# Altium schematic symbol library TI Amplifiers and Linear Operational Amplifier High Speed.SchLib: 1100 symbols (part 25 of 25)
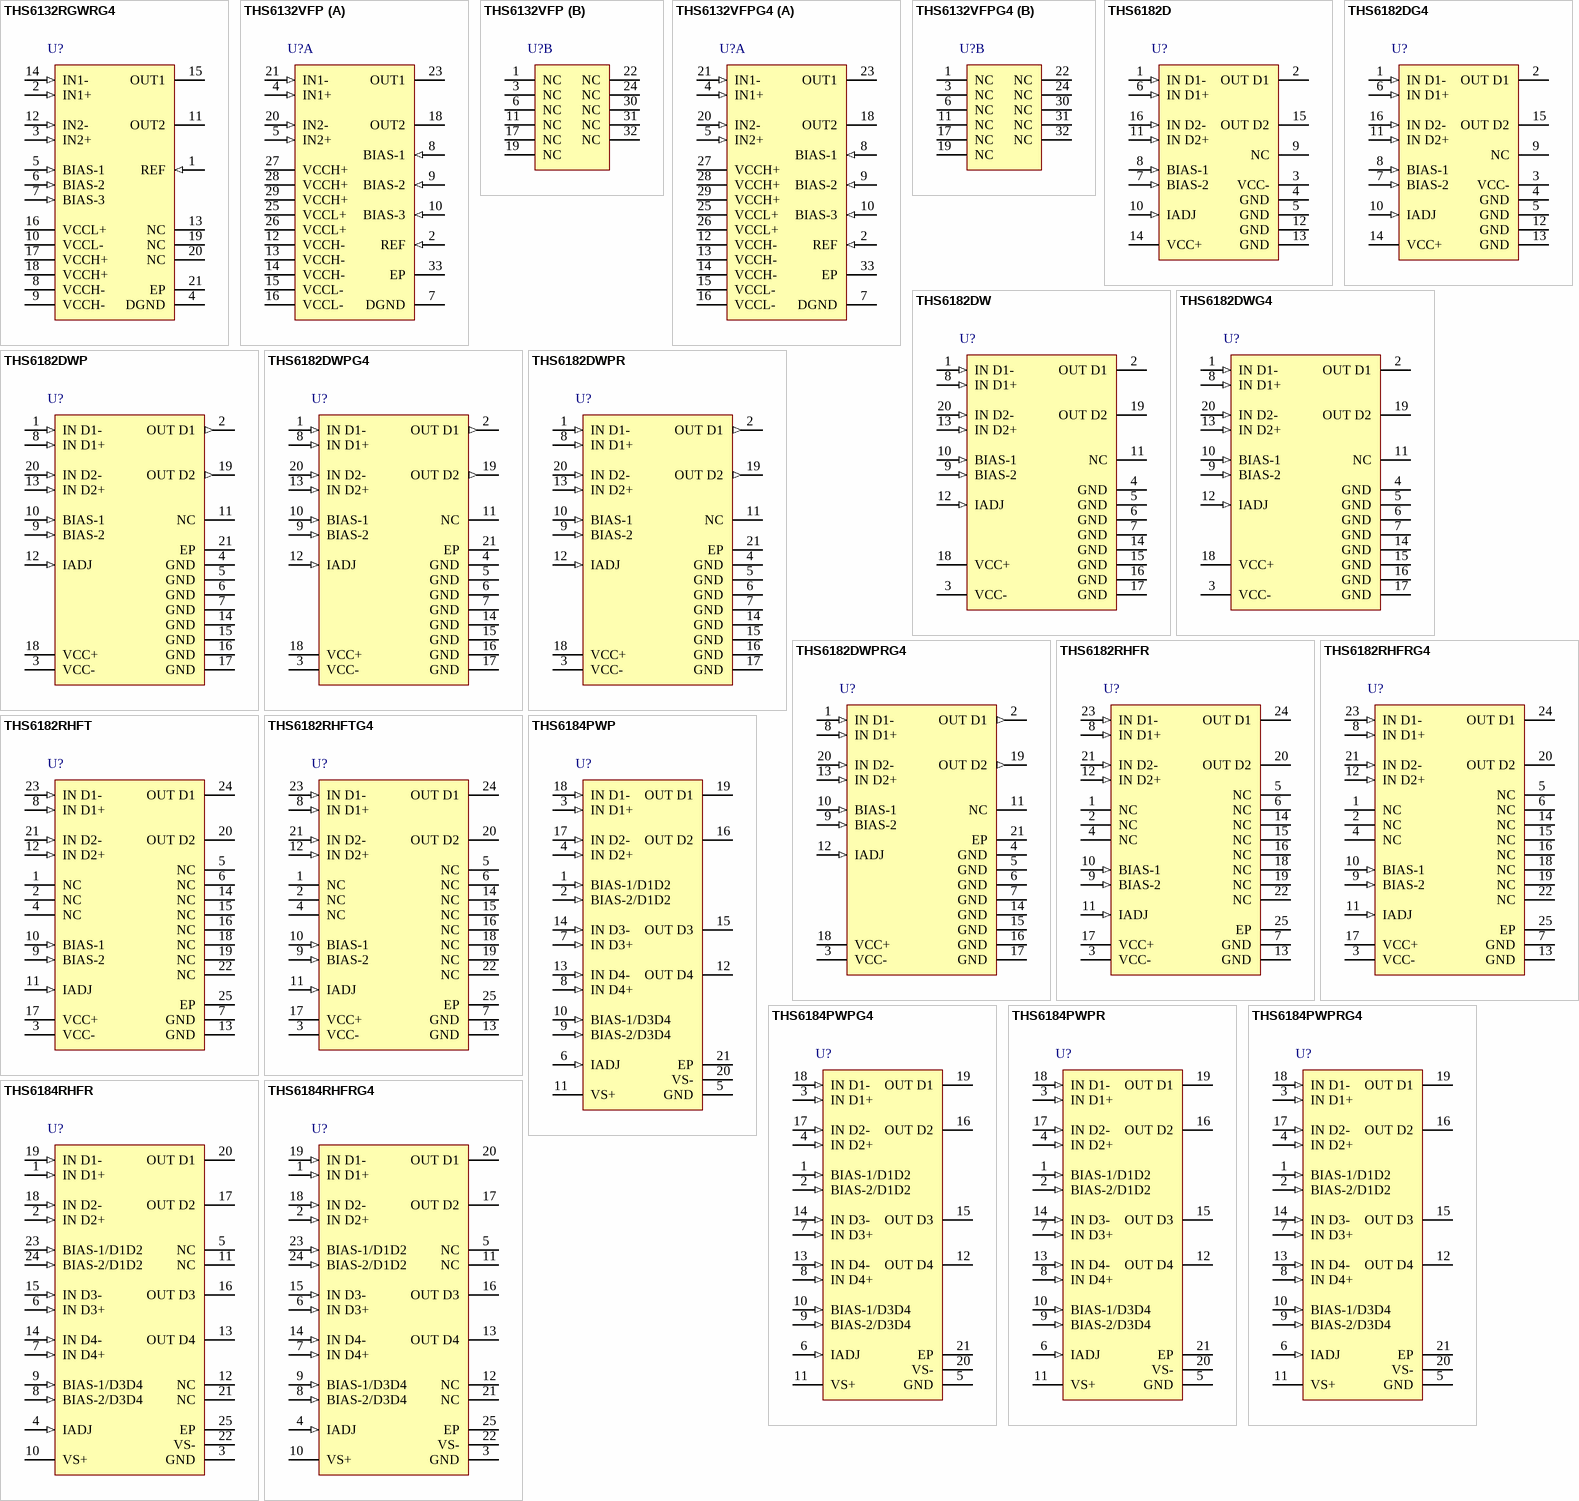
[diagram p75: symbols THS6132RGWRG4 to THS6184RHFRG4]

## THS6182RHFR
designator U?
Low Power Dissipation ADSL Line Driver, 10 to 30 V, -40 to 85 degC, 24-pin QFN (RHF24), Green (RoHS & no Sb/Br); Manufacturer: Texas Instruments; PartNumber: THS6182RHFR; 2nd Harmonic(dBc): 88; 3rd Harmonic(dBc): 107; @ MHz: 1; BW @ Acl(MHz): 100; Iib(Max)(nA): 20000; Io(Typ)(mA): 600; Iq per channel(Max)(mA): 12.5; Number of Channels: 2; Slew Rate(Typ)(V/us): 450; Sub Family: High Output Current Amplifier (>=50mA), High Speed Amplifier (>=50MHz), High Supply Voltage Amplifier (>=30V); THD (Fc is 1 MHz)(Typ)(dB): -88; Vio(Max)(mV): 20; Vn at Flatband(Typ)(nV/rtHz): 3.2; Vs(Max)(V): 30; Vs(Min)(V): 10; DatasheetVersion: SLLS544H; PackageVersion: 4204845-2/H, 06/2011; PackageReference: RHF24-3650X2650TP; PackageDescription: 24-Pin Plastic Flat Pack, Body 4 x 5 mm, Pitch 0.5 mm; Supplier 1: Digi-Key; Supplier Part Number 1: 296-15338-2-ND; Supplier 2: Digi-Key; Supplier Part Number 2: 296-15338-1-ND; Supplier 3: Digi-Key; Supplier Part Number 3: 296-15338-6-ND; Supplier 4: Newark; Supplier Part Number 4: 82H5816; Supplier 5: Mouser; Supplier Part Number 5: 595-THS6182RHFR; Acl, min stable gain(V/V): 1; Eco-Plan: Green (RoHS & no Sb/Br); Mounting Technology: Surface Mount; Code_JEDEC: MO-220; ComponentLink1Description: Manufacturer URL; ComponentLink1URL: http://www.ti.com/; ComponentLink2Description: Datasheet; ComponentLink2URL: http://www.ti.com/general/docs/lit/getliterature.tsp?genericPartNumber=THS6182&fileType=pdf; ComponentLink3Description: Package Specification; ComponentLink3URL: http://www.ti.com/litv/pdf/mpqf137g
footprint TI-RHF24-3650X2650TP_V (QFN, 24-Leads, Body 5x4mm, Pitch 0.5mm, Thermal Pad 3.65x2.65mm)
pins: 1 NC, 2 NC, 3 VCC- (power), 4 NC, 5 NC, 6 NC, 7 GND (power), 8 IN D1+ (in), 9 BIAS-2 (in), 10 BIAS-1 (in), 11 IADJ (in), 12 IN D2+ (in), 13 GND (power), 14 NC, 15 NC, 16 NC, 17 VCC+ (power), 18 NC, 19 NC, 20 OUT D2 (hiz), 21 IN D2- (in), 22 NC, 23 IN D1- (in), 24 OUT D1 (hiz), 25 EP (power)

## THS6182RHFRG4
designator U?
Low Power Dissipation ADSL Line Driver, 10 to 30 V, -40 to 85 degC, 24-pin QFN (RHF24), Green (RoHS & no Sb/Br); Manufacturer: Texas Instruments; PartNumber: THS6182RHFRG4; 2nd Harmonic(dBc): 88; 3rd Harmonic(dBc): 107; @ MHz: 1; BW @ Acl(MHz): 100; Iib(Max)(nA): 20000; Io(Typ)(mA): 600; Iq per channel(Max)(mA): 12.5; Number of Channels: 2; Slew Rate(Typ)(V/us): 450; Sub Family: High Output Current Amplifier (>=50mA), High Speed Amplifier (>=50MHz), High Supply Voltage Amplifier (>=30V); THD (Fc is 1 MHz)(Typ)(dB): -88; Vio(Max)(mV): 20; Vn at Flatband(Typ)(nV/rtHz): 3.2; Vs(Max)(V): 30; Vs(Min)(V): 10; DatasheetVersion: SLLS544H; PackageVersion: 4204845-2/H, 06/2011; PackageReference: RHF24-3650X2650TP; PackageDescription: 24-Pin Plastic Flat Pack, Body 4 x 5 mm, Pitch 0.5 mm; Supplier 1: Digi-Key; Supplier Part Number 1: THS6182RHFRG4-ND; Supplier 2: Newark; Supplier Part Number 2: 85K1610; Supplier 3: Mouser; Supplier Part Number 3: 595-THS6182RHFRG4; Acl, min stable gain(V/V): 1; Eco-Plan: Green (RoHS & no Sb/Br); Mounting Technology: Surface Mount; Code_JEDEC: MO-220; ComponentLink1Description: Manufacturer URL; ComponentLink1URL: http://www.ti.com/; ComponentLink2Description: Datasheet; ComponentLink2URL: http://www.ti.com/general/docs/lit/getliterature.tsp?genericPartNumber=THS6182&fileType=pdf; ComponentLink3Description: Package Specification; ComponentLink3URL: http://www.ti.com/litv/pdf/mpqf137g
footprint TI-RHF24-3650X2650TP_V (QFN, 24-Leads, Body 5x4mm, Pitch 0.5mm, Thermal Pad 3.65x2.65mm)
pins: 1 NC, 2 NC, 3 VCC- (power), 4 NC, 5 NC, 6 NC, 7 GND (power), 8 IN D1+ (in), 9 BIAS-2 (in), 10 BIAS-1 (in), 11 IADJ (in), 12 IN D2+ (in), 13 GND (power), 14 NC, 15 NC, 16 NC, 17 VCC+ (power), 18 NC, 19 NC, 20 OUT D2 (hiz), 21 IN D2- (in), 22 NC, 23 IN D1- (in), 24 OUT D1 (hiz), 25 EP (power)

## THS6182RHFT
designator U?
Low Power Dissipation ADSL Line Driver, 10 to 30 V, -40 to 85 degC, 24-pin QFN (RHF24), Green (RoHS & no Sb/Br); Manufacturer: Texas Instruments; PartNumber: THS6182RHFT; 2nd Harmonic(dBc): 88; 3rd Harmonic(dBc): 107; @ MHz: 1; BW @ Acl(MHz): 100; Iib(Max)(nA): 20000; Io(Typ)(mA): 600; Iq per channel(Max)(mA): 12.5; Number of Channels: 2; Slew Rate(Typ)(V/us): 450; Sub Family: High Output Current Amplifier (>=50mA), High Speed Amplifier (>=50MHz), High Supply Voltage Amplifier (>=30V); THD (Fc is 1 MHz)(Typ)(dB): -88; Vio(Max)(mV): 20; Vn at Flatband(Typ)(nV/rtHz): 3.2; Vs(Max)(V): 30; Vs(Min)(V): 10; DatasheetVersion: SLLS544H; PackageVersion: 4204845-2/H, 06/2011; PackageReference: RHF24-3650X2650TP; PackageDescription: 24-Pin Plastic Flat Pack, Body 4 x 5 mm, Pitch 0.5 mm; Supplier 1: Digi-Key; Supplier Part Number 1: THS6182RHFT-ND; Supplier 2: Mouser; Supplier Part Number 2: 595-THS6182RHFT; Acl, min stable gain(V/V): 1; Eco-Plan: Green (RoHS & no Sb/Br); Mounting Technology: Surface Mount; Code_JEDEC: MO-220; ComponentLink1Description: Manufacturer URL; ComponentLink1URL: http://www.ti.com/; ComponentLink2Description: Datasheet; ComponentLink2URL: http://www.ti.com/general/docs/lit/getliterature.tsp?genericPartNumber=THS6182&fileType=pdf; ComponentLink3Description: Package Specification; ComponentLink3URL: http://www.ti.com/litv/pdf/mpqf137g
footprint TI-RHF24-3650X2650TP_V (QFN, 24-Leads, Body 5x4mm, Pitch 0.5mm, Thermal Pad 3.65x2.65mm)
pins: 1 NC, 2 NC, 3 VCC- (power), 4 NC, 5 NC, 6 NC, 7 GND (power), 8 IN D1+ (in), 9 BIAS-2 (in), 10 BIAS-1 (in), 11 IADJ (in), 12 IN D2+ (in), 13 GND (power), 14 NC, 15 NC, 16 NC, 17 VCC+ (power), 18 NC, 19 NC, 20 OUT D2 (hiz), 21 IN D2- (in), 22 NC, 23 IN D1- (in), 24 OUT D1 (hiz), 25 EP (power)

## THS6182RHFTG4
designator U?
Low Power Dissipation ADSL Line Driver, 10 to 30 V, -40 to 85 degC, 24-pin QFN (RHF24), Green (RoHS & no Sb/Br); Manufacturer: Texas Instruments; PartNumber: THS6182RHFTG4; 2nd Harmonic(dBc): 88; 3rd Harmonic(dBc): 107; @ MHz: 1; BW @ Acl(MHz): 100; Iib(Max)(nA): 15000; Io(Typ)(mA): 600; Iq per channel(Max)(mA): 12.5; Number of Channels: 2; Slew Rate(Typ)(V/us): 450; Sub Family: High Output Current Amplifier (>=50mA), High Speed Amplifier (>=50MHz), High Supply Voltage Amplifier (>=30V); THD (Fc is 1 MHz)(Typ)(dB): -88; Vio(Max)(mV): 20; Vn at Flatband(Typ)(nV/rtHz): 3.2; Vs(Max)(V): 30; Vs(Min)(V): 10; DatasheetVersion: SLLS544H; PackageVersion: 4204845-2/H, 06/2011; PackageReference: RHF24-3650X2650TP; PackageDescription: 24-Pin Plastic Flat Pack, Body 4 x 5 mm, Pitch 0.5 mm; Supplier 1: Digi-Key; Supplier Part Number 1: THS6182RHFTG4-ND; Supplier 2: Newark; Supplier Part Number 2: 54K0778; Supplier 3: Mouser; Supplier Part Number 3: 595-THS6182RHFTG4; Acl, min stable gain(V/V): 1; Eco-Plan: Green (RoHS & no Sb/Br); Mounting Technology: Surface Mount; Code_JEDEC: MO-220; ComponentLink1Description: Manufacturer URL; ComponentLink1URL: http://www.ti.com/; ComponentLink2Description: Datasheet; ComponentLink2URL: http://www.ti.com/general/docs/lit/getliterature.tsp?genericPartNumber=THS6182&fileType=pdf; ComponentLink3Description: Package Specification; ComponentLink3URL: http://www.ti.com/litv/pdf/mpqf137g
footprint TI-RHF24-3650X2650TP_V (QFN, 24-Leads, Body 5x4mm, Pitch 0.5mm, Thermal Pad 3.65x2.65mm)
pins: 1 NC, 2 NC, 3 VCC- (power), 4 NC, 5 NC, 6 NC, 7 GND (power), 8 IN D1+ (in), 9 BIAS-2 (in), 10 BIAS-1 (in), 11 IADJ (in), 12 IN D2+ (in), 13 GND (power), 14 NC, 15 NC, 16 NC, 17 VCC+ (power), 18 NC, 19 NC, 20 OUT D2 (hiz), 21 IN D2- (in), 22 NC, 23 IN D1- (in), 24 OUT D1 (hiz), 25 EP (power)

## THS6184PWP
designator U?
xDSL Line Driver, 8 to 32 V, -40 to 85 degC, 20-pin SOP (PWP20), Green (RoHS & no Sb/Br); Manufacturer: Texas Instruments; PartNumber: THS6184PWP; Acl, min stable gain(V/V): 1; BW @ Acl(MHz): 50; Iib(Max)(nA): 15; Io(Typ)(mA): 500; Iq per channel(Max)(mA): 4.2; Number of Channels: 4; Slew Rate(Typ)(V/us): 400; Sub Family: High Output Current Amplifier (>=50mA), High Speed Amplifier (>=50MHz); Vio(Max)(mV): 16; Vn at Flatband(Typ)(nV/rtHz): 2.9; DatasheetVersion: SLLS635D; PackageVersion: 4073225-4/I, 05/2011; PackageReference: PWP20-2965X2290TP; PackageDescription: 20-Pin Plastic Small Outline, Body 4.4 x 6.5 mm, Pitch 0.65 mm; Supplier 1: Digi-Key; Supplier Part Number 1: 296-21670-5-ND; Supplier 2: Farnell; Supplier Part Number 2: 1755442; Supplier 3: Newark; Supplier Part Number 3: 37M0029; Supplier 4: Mouser; Supplier Part Number 4: 595-THS6184PWP; Eco-Plan: Green (RoHS & no Sb/Br); Mounting Technology: Surface Mount; Code_JEDEC: MO-153; ComponentLink1Description: Manufacturer URL; ComponentLink1URL: http://www.ti.com/; ComponentLink2Description: Datasheet; ComponentLink2URL: http://www.ti.com/general/docs/lit/getliterature.tsp?genericPartNumber=THS6184&fileType=pdf; ComponentLink3Description: Package Specification; ComponentLink3URL: http://www.ti.com/litv/pdf/mhts001g
footprint TI-PWP20-2965X2290TP_N (SOP, 20-Leads, Body 6.5x4.4mm, Pitch 0.65mm, Thermal Pad 2.965x2.29mm, IPC Medium Density)
footprint TI-PWP20-2965X2290TP_L (SOP, 20-Leads, Body 6.5x4.4mm, Pitch 0.65mm, Thermal Pad 2.965x2.29mm, IPC High Density)
footprint TI-PWP20-2965X2290TP_M (SOP, 20-Leads, Body 6.5x4.4mm, Pitch 0.65mm, Thermal Pad 2.965x2.29mm, IPC Low Density)
pins: 1 BIAS-1/D1D2 (in), 2 BIAS-2/D1D2 (in), 3 IN D1+ (in), 4 IN D2+ (in), 5 GND (power), 6 IADJ (in), 7 IN D3+ (in), 8 IN D4+ (in), 9 BIAS-2/D3D4 (in), 10 BIAS-1/D3D4 (in), 11 VS+ (power), 12 OUT D4 (hiz), 13 IN D4- (in), 14 IN D3- (in), 15 OUT D3 (hiz), 16 OUT D2 (hiz), 17 IN D2- (in), 18 IN D1- (in), 19 OUT D1 (hiz), 20 VS- (power), 21 EP (power)

## THS6184PWPG4
designator U?
xDSL Line Driver, 8 to 32 V, -40 to 85 degC, 20-pin SOP (PWP20), Green (RoHS & no Sb/Br); Manufacturer: Texas Instruments; PartNumber: THS6184PWPG4; Acl, min stable gain(V/V): 1; BW @ Acl(MHz): 50; Iib(Max)(nA): 15; Io(Typ)(mA): 500; Iq per channel(Max)(mA): 4.2; Number of Channels: 4; Slew Rate(Typ)(V/us): 400; Sub Family: High Output Current Amplifier (>=50mA), High Speed Amplifier (>=50MHz); Vio(Max)(mV): 16; Vn at Flatband(Typ)(nV/rtHz): 2.9; DatasheetVersion: SLLS635D; PackageVersion: 4073225-4/I, 05/2011; PackageReference: PWP20-2965X2290TP; PackageDescription: 20-Pin Plastic Small Outline, Body 4.4 x 6.5 mm, Pitch 0.65 mm; Supplier 1: Digi-Key; Supplier Part Number 1: THS6184PWPG4-ND; Supplier 2: Mouser; Supplier Part Number 2: 595-THS6184PWPG4; Eco-Plan: Green (RoHS & no Sb/Br); Mounting Technology: Surface Mount; Code_JEDEC: MO-153; ComponentLink1Description: Manufacturer URL; ComponentLink1URL: http://www.ti.com/; ComponentLink2Description: Datasheet; ComponentLink2URL: http://www.ti.com/general/docs/lit/getliterature.tsp?genericPartNumber=THS6184&fileType=pdf; ComponentLink3Description: Package Specification; ComponentLink3URL: http://www.ti.com/litv/pdf/mhts001g
footprint TI-PWP20-2965X2290TP_N (SOP, 20-Leads, Body 6.5x4.4mm, Pitch 0.65mm, Thermal Pad 2.965x2.29mm, IPC Medium Density)
footprint TI-PWP20-2965X2290TP_L (SOP, 20-Leads, Body 6.5x4.4mm, Pitch 0.65mm, Thermal Pad 2.965x2.29mm, IPC High Density)
footprint TI-PWP20-2965X2290TP_M (SOP, 20-Leads, Body 6.5x4.4mm, Pitch 0.65mm, Thermal Pad 2.965x2.29mm, IPC Low Density)
pins: 1 BIAS-1/D1D2 (in), 2 BIAS-2/D1D2 (in), 3 IN D1+ (in), 4 IN D2+ (in), 5 GND (power), 6 IADJ (in), 7 IN D3+ (in), 8 IN D4+ (in), 9 BIAS-2/D3D4 (in), 10 BIAS-1/D3D4 (in), 11 VS+ (power), 12 OUT D4 (hiz), 13 IN D4- (in), 14 IN D3- (in), 15 OUT D3 (hiz), 16 OUT D2 (hiz), 17 IN D2- (in), 18 IN D1- (in), 19 OUT D1 (hiz), 20 VS- (power), 21 EP (power)

## THS6184PWPR
designator U?
xDSL Line Driver, 8 to 32 V, -40 to 85 degC, 20-pin SOP (PWP20), Green (RoHS & no Sb/Br); Manufacturer: Texas Instruments; PartNumber: THS6184PWPR; Acl, min stable gain(V/V): 1; BW @ Acl(MHz): 50; Iib(Max)(nA): 15; Io(Typ)(mA): 500; Iq per channel(Max)(mA): 4.2; Number of Channels: 4; Slew Rate(Typ)(V/us): 400; Sub Family: High Output Current Amplifier (>=50mA), High Speed Amplifier (>=50MHz); Vio(Max)(mV): 16; Vn at Flatband(Typ)(nV/rtHz): 2.9; DatasheetVersion: SLLS635D; PackageVersion: 4073225-4/I, 05/2011; PackageReference: PWP20-2965X2290TP; PackageDescription: 20-Pin Plastic Small Outline, Body 4.4 x 6.5 mm, Pitch 0.65 mm; Supplier 1: Digi-Key; Supplier Part Number 1: THS6184PWPR-ND; Supplier 2: Mouser; Supplier Part Number 2: 595-THS6184PWPR; Eco-Plan: Green (RoHS & no Sb/Br); Mounting Technology: Surface Mount; Code_JEDEC: MO-153; ComponentLink1Description: Manufacturer URL; ComponentLink1URL: http://www.ti.com/; ComponentLink2Description: Datasheet; ComponentLink2URL: http://www.ti.com/general/docs/lit/getliterature.tsp?genericPartNumber=THS6184&fileType=pdf; ComponentLink3Description: Package Specification; ComponentLink3URL: http://www.ti.com/litv/pdf/mhts001g
footprint TI-PWP20-2965X2290TP_N (SOP, 20-Leads, Body 6.5x4.4mm, Pitch 0.65mm, Thermal Pad 2.965x2.29mm, IPC Medium Density)
footprint TI-PWP20-2965X2290TP_L (SOP, 20-Leads, Body 6.5x4.4mm, Pitch 0.65mm, Thermal Pad 2.965x2.29mm, IPC High Density)
footprint TI-PWP20-2965X2290TP_M (SOP, 20-Leads, Body 6.5x4.4mm, Pitch 0.65mm, Thermal Pad 2.965x2.29mm, IPC Low Density)
pins: 1 BIAS-1/D1D2 (in), 2 BIAS-2/D1D2 (in), 3 IN D1+ (in), 4 IN D2+ (in), 5 GND (power), 6 IADJ (in), 7 IN D3+ (in), 8 IN D4+ (in), 9 BIAS-2/D3D4 (in), 10 BIAS-1/D3D4 (in), 11 VS+ (power), 12 OUT D4 (hiz), 13 IN D4- (in), 14 IN D3- (in), 15 OUT D3 (hiz), 16 OUT D2 (hiz), 17 IN D2- (in), 18 IN D1- (in), 19 OUT D1 (hiz), 20 VS- (power), 21 EP (power)

## THS6184PWPRG4
designator U?
xDSL Line Driver, 8 to 32 V, -40 to 85 degC, 20-pin SOP (PWP20), Green (RoHS & no Sb/Br); Manufacturer: Texas Instruments; PartNumber: THS6184PWPRG4; Acl, min stable gain(V/V): 1; BW @ Acl(MHz): 50; Iib(Max)(nA): 15; Io(Typ)(mA): 500; Iq per channel(Max)(mA): 4.2; Number of Channels: 4; Slew Rate(Typ)(V/us): 400; Sub Family: High Output Current Amplifier (>=50mA), High Speed Amplifier (>=50MHz); Vio(Max)(mV): 16; Vn at Flatband(Typ)(nV/rtHz): 2.9; DatasheetVersion: SLLS635D; PackageVersion: 4073225-4/I, 05/2011; PackageReference: PWP20-2965X2290TP; PackageDescription: 20-Pin Plastic Small Outline, Body 4.4 x 6.5 mm, Pitch 0.65 mm; Supplier 1: Digi-Key; Supplier Part Number 1: THS6184PWPRG4-ND; Supplier 2: Mouser; Supplier Part Number 2: 595-THS6184PWPRG4; Eco-Plan: Green (RoHS & no Sb/Br); Mounting Technology: Surface Mount; Code_JEDEC: MO-153; ComponentLink1Description: Manufacturer URL; ComponentLink1URL: http://www.ti.com/; ComponentLink2Description: Datasheet; ComponentLink2URL: http://www.ti.com/general/docs/lit/getliterature.tsp?genericPartNumber=THS6184&fileType=pdf; ComponentLink3Description: Package Specification; ComponentLink3URL: http://www.ti.com/litv/pdf/mhts001g
footprint TI-PWP20-2965X2290TP_N (SOP, 20-Leads, Body 6.5x4.4mm, Pitch 0.65mm, Thermal Pad 2.965x2.29mm, IPC Medium Density)
footprint TI-PWP20-2965X2290TP_L (SOP, 20-Leads, Body 6.5x4.4mm, Pitch 0.65mm, Thermal Pad 2.965x2.29mm, IPC High Density)
footprint TI-PWP20-2965X2290TP_M (SOP, 20-Leads, Body 6.5x4.4mm, Pitch 0.65mm, Thermal Pad 2.965x2.29mm, IPC Low Density)
pins: 1 BIAS-1/D1D2 (in), 2 BIAS-2/D1D2 (in), 3 IN D1+ (in), 4 IN D2+ (in), 5 GND (power), 6 IADJ (in), 7 IN D3+ (in), 8 IN D4+ (in), 9 BIAS-2/D3D4 (in), 10 BIAS-1/D3D4 (in), 11 VS+ (power), 12 OUT D4 (hiz), 13 IN D4- (in), 14 IN D3- (in), 15 OUT D3 (hiz), 16 OUT D2 (hiz), 17 IN D2- (in), 18 IN D1- (in), 19 OUT D1 (hiz), 20 VS- (power), 21 EP (power)

## THS6184RHFR
designator U?
xDSL Line Driver, 8 to 32 V, -40 to 85 degC, 24-pin QFN (RHF24), Green (RoHS & no Sb/Br); Manufacturer: Texas Instruments; PartNumber: THS6184RHFR; Acl, min stable gain(V/V): 1; BW @ Acl(MHz): 50; Iib(Max)(nA): 15; Io(Typ)(mA): 500; Iq per channel(Max)(mA): 4.2; Number of Channels: 4; Slew Rate(Typ)(V/us): 400; Sub Family: High Output Current Amplifier (>=50mA), High Speed Amplifier (>=50MHz); Vio(Max)(mV): 16; Vn at Flatband(Typ)(nV/rtHz): 2.9; DatasheetVersion: SLLS635D; PackageVersion: 4204845-2/H, 06/2011; PackageReference: RHF24-3650X2650TP; PackageDescription: 24-Pin Plastic Flat Pack, Body 4 x 5 mm, Pitch 0.5 mm; Supplier 1: Digi-Key; Supplier Part Number 1: THS6184RHFR-ND; Supplier 2: Newark; Supplier Part Number 2: 24K5087; Supplier 3: Mouser; Supplier Part Number 3: 595-THS6184RHFR; Eco-Plan: Green (RoHS & no Sb/Br); Mounting Technology: Surface Mount; Code_JEDEC: MO-220; ComponentLink1Description: Manufacturer URL; ComponentLink1URL: http://www.ti.com/; ComponentLink2Description: Datasheet; ComponentLink2URL: http://www.ti.com/general/docs/lit/getliterature.tsp?genericPartNumber=THS6184&fileType=pdf; ComponentLink3Description: Package Specification; ComponentLink3URL: http://www.ti.com/litv/pdf/mpqf137g
footprint TI-RHF24-3650X2650TP_V (QFN, 24-Leads, Body 5x4mm, Pitch 0.5mm, Thermal Pad 3.65x2.65mm)
pins: 1 IN D1+ (in), 2 IN D2+ (in), 3 GND (power), 4 IADJ (in), 5 NC, 6 IN D3+ (in), 7 IN D4+ (in), 8 BIAS-2/D3D4 (in), 9 BIAS-1/D3D4 (in), 10 VS+ (power), 11 NC, 12 NC, 13 OUT D4 (hiz), 14 IN D4- (in), 15 IN D3- (in), 16 OUT D3 (hiz), 17 OUT D2 (hiz), 18 IN D2- (in), 19 IN D1- (in), 20 OUT D1 (hiz), 21 NC, 22 VS- (power), 23 BIAS-1/D1D2 (in), 24 BIAS-2/D1D2 (in), 25 EP (power)

## THS6184RHFRG4
designator U?
xDSL Line Driver, 8 to 32 V, -40 to 85 degC, 24-pin QFN (RHF24), Green (RoHS & no Sb/Br); Manufacturer: Texas Instruments; PartNumber: THS6184RHFRG4; Acl, min stable gain(V/V): 1; BW @ Acl(MHz): 50; Iib(Max)(nA): 15; Io(Typ)(mA): 500; Iq per channel(Max)(mA): 4.2; Number of Channels: 4; Slew Rate(Typ)(V/us): 400; Sub Family: High Output Current Amplifier (>=50mA), High Speed Amplifier (>=50MHz); Vio(Max)(mV): 16; Vn at Flatband(Typ)(nV/rtHz): 2.9; DatasheetVersion: SLLS635D; PackageVersion: 4204845-2/H, 06/2011; PackageReference: RHF24-3650X2650TP; PackageDescription: 24-Pin Plastic Flat Pack, Body 4 x 5 mm, Pitch 0.5 mm; Supplier 1: Digi-Key; Supplier Part Number 1: THS6184RHFRG4-ND; Supplier 2: Mouser; Supplier Part Number 2: 595-THS6184RHFRG4; Eco-Plan: Green (RoHS & no Sb/Br); Mounting Technology: Surface Mount; Code_JEDEC: MO-220; ComponentLink1Description: Manufacturer URL; ComponentLink1URL: http://www.ti.com/; ComponentLink2Description: Datasheet; ComponentLink2URL: http://www.ti.com/general/docs/lit/getliterature.tsp?genericPartNumber=THS6184&fileType=pdf; ComponentLink3Description: Package Specification; ComponentLink3URL: http://www.ti.com/litv/pdf/mpqf137g
footprint TI-RHF24-3650X2650TP_V (QFN, 24-Leads, Body 5x4mm, Pitch 0.5mm, Thermal Pad 3.65x2.65mm)
pins: 1 IN D1+ (in), 2 IN D2+ (in), 3 GND (power), 4 IADJ (in), 5 NC, 6 IN D3+ (in), 7 IN D4+ (in), 8 BIAS-2/D3D4 (in), 9 BIAS-1/D3D4 (in), 10 VS+ (power), 11 NC, 12 NC, 13 OUT D4 (hiz), 14 IN D4- (in), 15 IN D3- (in), 16 OUT D3 (hiz), 17 OUT D2 (hiz), 18 IN D2- (in), 19 IN D1- (in), 20 OUT D1 (hiz), 21 NC, 22 VS- (power), 23 BIAS-1/D1D2 (in), 24 BIAS-2/D1D2 (in), 25 EP (power)

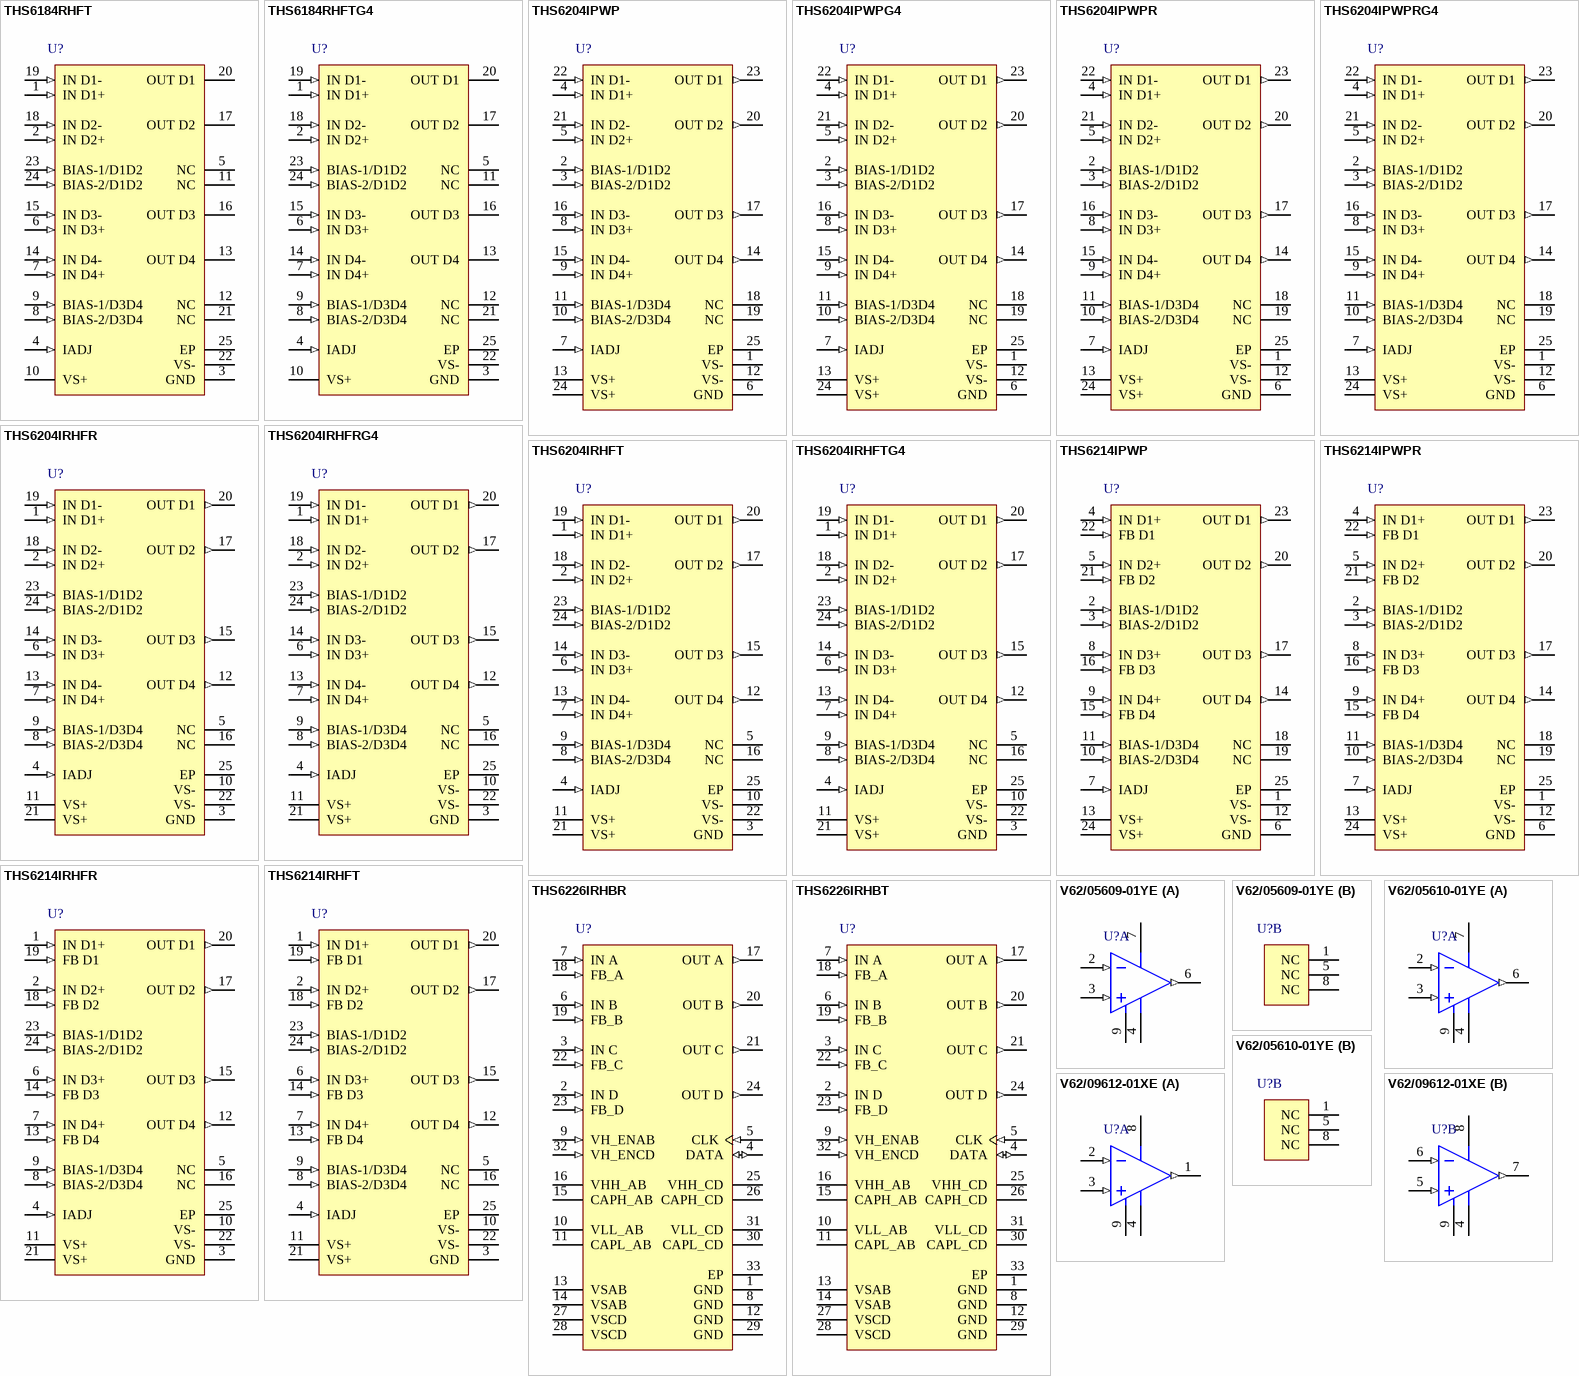
[diagram p51: symbols THS6184RHFT to V62/09612-01XE]

## THS6184RHFT
designator U?
xDSL Line Driver, 8 to 32 V, -40 to 85 degC, 24-pin QFN (RHF24), Green (RoHS & no Sb/Br); Manufacturer: Texas Instruments; PartNumber: THS6184RHFT; Acl, min stable gain(V/V): 1; BW @ Acl(MHz): 50; Iib(Max)(nA): 15; Io(Typ)(mA): 500; Iq per channel(Max)(mA): 4.2; Number of Channels: 4; Slew Rate(Typ)(V/us): 400; Sub Family: High Output Current Amplifier (>=50mA), High Speed Amplifier (>=50MHz); Vio(Max)(mV): 16; Vn at Flatband(Typ)(nV/rtHz): 2.9; DatasheetVersion: SLLS635D; PackageVersion: 4204845-2/H, 06/2011; PackageReference: RHF24-3650X2650TP; PackageDescription: 24-Pin Plastic Flat Pack, Body 4 x 5 mm, Pitch 0.5 mm; Supplier 1: Digi-Key; Supplier Part Number 1: 296-17862-2-ND; Supplier 2: Digi-Key; Supplier Part Number 2: 296-17862-1-ND; Supplier 3: Digi-Key; Supplier Part Number 3: 296-17862-6-ND; Supplier 4: Mouser; Supplier Part Number 4: 595-THS6184RHFT; Eco-Plan: Green (RoHS & no Sb/Br); Mounting Technology: Surface Mount; Code_JEDEC: MO-220; ComponentLink1Description: Manufacturer URL; ComponentLink1URL: http://www.ti.com/; ComponentLink2Description: Datasheet; ComponentLink2URL: http://www.ti.com/general/docs/lit/getliterature.tsp?genericPartNumber=THS6184&fileType=pdf; ComponentLink3Description: Package Specification; ComponentLink3URL: http://www.ti.com/litv/pdf/mpqf137g
footprint TI-RHF24-3650X2650TP_V (QFN, 24-Leads, Body 5x4mm, Pitch 0.5mm, Thermal Pad 3.65x2.65mm)
pins: 1 IN D1+ (in), 2 IN D2+ (in), 3 GND (power), 4 IADJ (in), 5 NC, 6 IN D3+ (in), 7 IN D4+ (in), 8 BIAS-2/D3D4 (in), 9 BIAS-1/D3D4 (in), 10 VS+ (power), 11 NC, 12 NC, 13 OUT D4 (hiz), 14 IN D4- (in), 15 IN D3- (in), 16 OUT D3 (hiz), 17 OUT D2 (hiz), 18 IN D2- (in), 19 IN D1- (in), 20 OUT D1 (hiz), 21 NC, 22 VS- (power), 23 BIAS-1/D1D2 (in), 24 BIAS-2/D1D2 (in), 25 EP (power)

## THS6184RHFTG4
designator U?
xDSL Line Driver, 8 to 32 V, -40 to 85 degC, 24-pin QFN (RHF24), Green (RoHS & no Sb/Br); Manufacturer: Texas Instruments; PartNumber: THS6184RHFTG4; 2nd Harmonic(dBc): 89; 3rd Harmonic(dBc): 85; @ MHz: 1; BW @ Acl(MHz): 50; Iib(Max)(nA): 15000; Io(Typ)(mA): 416; Iq per channel(Max)(mA): 4.2; Number of Channels: 4; Slew Rate(Typ)(V/us): 275; Sub Family: High Output Current Amplifier (>=50mA), High Speed Amplifier (>=50MHz); THD (Fc is 1 MHz)(Typ)(dB): -83; Vio(Max)(mV): 25; Vn at Flatband(Typ)(nV/rtHz): 3; Vs(Max)(V): 32; Vs(Min)(V): 8; DatasheetVersion: SLLS635D; PackageVersion: 4204845-2/H, 06/2011; PackageReference: RHF24-3650X2650TP; PackageDescription: 24-Pin Plastic Flat Pack, Body 4 x 5 mm, Pitch 0.5 mm; Supplier 1: Digi-Key; Supplier Part Number 1: THS6184RHFTG4-ND; Supplier 2: Mouser; Supplier Part Number 2: 595-THS6184RHFTG4; Acl, min stable gain(V/V): 1; Eco-Plan: Green (RoHS & no Sb/Br); Mounting Technology: Surface Mount; Code_JEDEC: MO-220; ComponentLink1Description: Manufacturer URL; ComponentLink1URL: http://www.ti.com/; ComponentLink2Description: Datasheet; ComponentLink2URL: http://www.ti.com/general/docs/lit/getliterature.tsp?genericPartNumber=THS6184&fileType=pdf; ComponentLink3Description: Package Specification; ComponentLink3URL: http://www.ti.com/litv/pdf/mpqf137g
footprint TI-RHF24-3650X2650TP_V (QFN, 24-Leads, Body 5x4mm, Pitch 0.5mm, Thermal Pad 3.65x2.65mm)
pins: 1 IN D1+ (in), 2 IN D2+ (in), 3 GND (power), 4 IADJ (in), 5 NC, 6 IN D3+ (in), 7 IN D4+ (in), 8 BIAS-2/D3D4 (in), 9 BIAS-1/D3D4 (in), 10 VS+ (power), 11 NC, 12 NC, 13 OUT D4 (hiz), 14 IN D4- (in), 15 IN D3- (in), 16 OUT D3 (hiz), 17 OUT D2 (hiz), 18 IN D2- (in), 19 IN D1- (in), 20 OUT D1 (hiz), 21 NC, 22 VS- (power), 23 BIAS-1/D1D2 (in), 24 BIAS-2/D1D2 (in), 25 EP (power)

## THS6204IPWP
designator U?
Dual Port VDSL2 Line Driver Amplifier, 10 to 28 V, -40 to 85 degC, 24-pin SOP (PWP24), Green (RoHS & no Sb/Br); Manufacturer: Texas Instruments; PartNumber: THS6204IPWP; 2nd Harmonic(dBc): 100; 3rd Harmonic(dBc): 89; @ MHz: 1; Acl, min stable gain(V/V): 2; BW @ Acl(MHz): 160; Iib(Max)(nA): 50000; Io(Typ)(mA): 416; Iq per channel(Max)(mA): 21; Slew Rate(Typ)(V/us): 3800; Sub Family: High Output Current Amplifier (>=50mA), High Speed Amplifier (>=50MHz); Vio(Max)(mV): 60; Vn at Flatband(Typ)(nV/rtHz): 2.5; Vs(Max)(V): 28; Vs(Min)(V): 10; DatasheetVersion: SBOS416C; PackageVersion: 4073225-5/I, 05/2011; PackageReference: PWP24-4420X1950TP; PackageDescription: 24-Pin Plastic Small Outline, Body 4.4 x 7.8 mm, Pitch 0.65 mm; Supplier 1: Digi-Key; Supplier Part Number 1: 296-23694-5-ND; Supplier 2: Farnell; Supplier Part Number 2: 1755276; Supplier 3: Mouser; Supplier Part Number 3: 595-THS6204IPWP; Eco-Plan: Green (RoHS & no Sb/Br); Number of Channels: 2; Mounting Technology: Surface Mount; Code_JEDEC: MO-153; ComponentLink1Description: Manufacturer URL; ComponentLink1URL: http://www.ti.com/; ComponentLink2Description: Datasheet; ComponentLink2URL: http://www.ti.com/general/docs/lit/getliterature.tsp?genericPartNumber=THS6204&fileType=pdf; ComponentLink3Description: Package Specification; ComponentLink3URL: http://www.ti.com/lit/ds/symlink/tps65101.pdf
footprint TI-PWP24-4420X1950TP_N (SOP, 24-Leads, Body 7.8x4.4mm, Pitch 0.65mm, Thermal Pad 4.42x1.95mm, IPC Medium Density)
footprint TI-PWP24-4420X1950TP_L (SOP, 24-Leads, Body 7.8x4.4mm, Pitch 0.65mm, Thermal Pad 4.42x1.95mm, IPC High Density)
footprint TI-PWP24-4420X1950TP_M (SOP, 24-Leads, Body 7.8x4.4mm, Pitch 0.65mm, Thermal Pad 4.42x1.95mm, IPC Low Density)
pins: 1 VS- (power), 2 BIAS-1/D1D2 (in), 3 BIAS-2/D1D2 (in), 4 IN D1+ (in), 5 IN D2+ (in), 6 GND (power), 7 IADJ (in), 8 IN D3+ (in), 9 IN D4+ (in), 10 BIAS-2/D3D4 (in), 11 BIAS-1/D3D4 (in), 12 VS- (power), 13 VS+ (power), 14 OUT D4 (out), 15 IN D4- (in), 16 IN D3- (in), 17 OUT D3 (out), 18 NC, 19 NC, 20 OUT D2 (out), 21 IN D2- (in), 22 IN D1- (in), 23 OUT D1 (out), 24 VS+ (power), 25 EP (power)